# Altium footprint library JL_PCB.PCBLIB: 1129 footprints (part 52 of 72)
Each footprint in its own frame and in the unit in brackets; x right, y up, seen from the top. Pads: shape width x height; smd on the part's side, far side on the other; paste and mask are expansions set on the pad; w line width, h text height; cw(c..) or ccw(c..) is an arc to the next point about the centre after c.
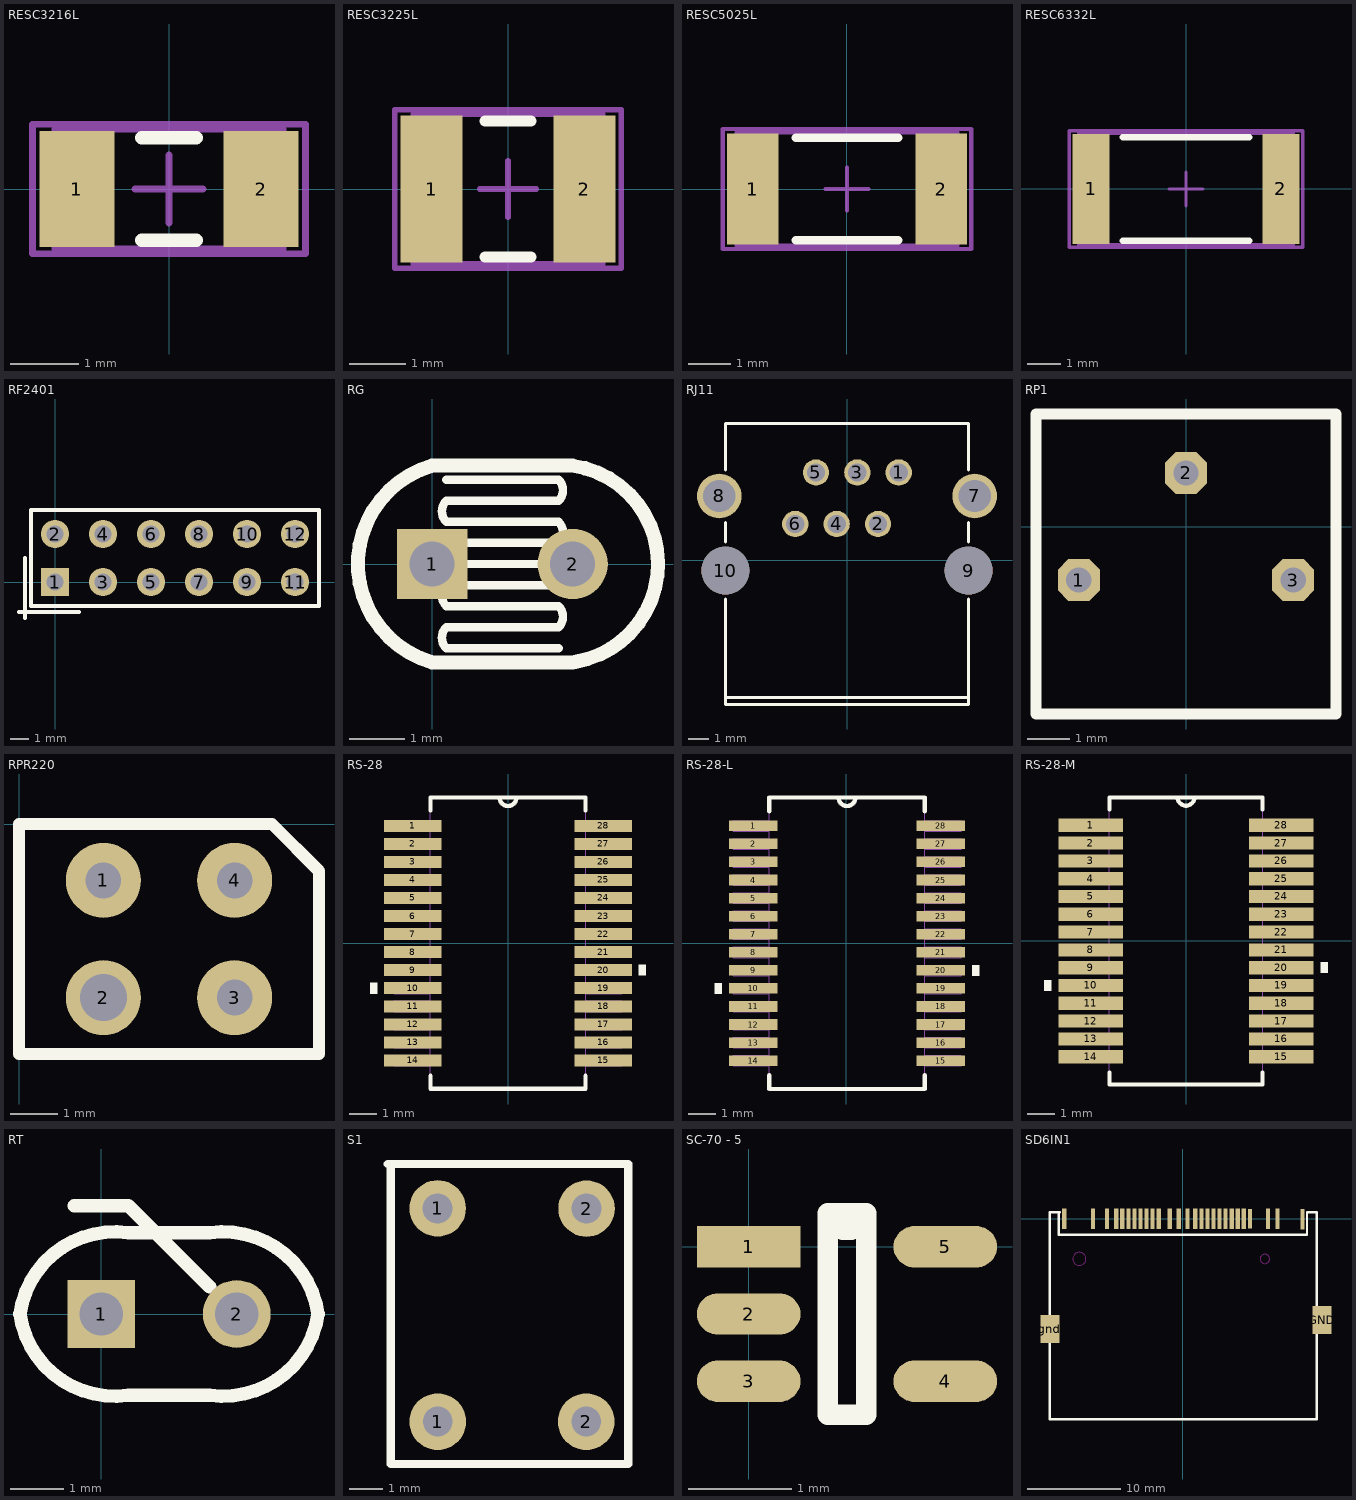
[diagram p51: the footprints below, top view; thin cyan lines are the x and y axes]

## RESC3216L [mm] "Chip Resistor, Body 3.1x1.6mm, IPC High Density"
height 2.54
pads (2):
  rect 1.1x1.7 smd: 1(-1.35,0) 2(1.35,0)
TopOverlay:
  lines w0.2: -0.4,-0.75 0.4,-0.75 ; -0.4,0.75 0.4,0.75
Mechanical13:
  lines w0.1: -1.675,-0.875 -1.675,0.875 1.675,0.875 1.675,-0.875 -1.675,-0.875
Mechanical15:
  lines w0.1: -0.5,0 0.5,0 ; 0,-0.5 0,0.5 ; -2,-0.95 -2,0.95 2,0.95 2,-0.95 -2,-0.95
3D body: height 2.54, standoff 0, extent -1.675,-0.875 1.675,0.875

## RESC3225L [mm] "Chip Resistor, Body 3.2x2.5mm, IPC High Density"
height 0.9
pads (2):
  rect 1.1x2.6 smd: 1(-1.35,0) 2(1.35,0)
TopOverlay:
  lines w0.2: -0.4,-1.2 0.4,-1.2 ; -0.4,1.2 0.4,1.2
Mechanical13:
  lines w0.1: -1.675,-1.32 -1.675,1.32 1.675,1.32 1.675,-1.32 -1.675,-1.32
Mechanical15:
  lines w0.1: -0.5,0 0.5,0 ; 0,-0.5 0,0.5 ; -2,-1.4 -2,1.4 2,1.4 2,-1.4 -2,-1.4
3D body: height 0.9, standoff 0, extent -1.675,-1.32 1.675,1.32

## RESC5025L [mm] "Chip Resistor, Body 5.0x2.5mm, IPC High Density"
height 0.9
pads (2):
  rect 1.2x2.6 smd: 1(-2.2,0) 2(2.2,0)
TopOverlay:
  lines w0.2: -1.2,-1.2 1.2,-1.2 ; -1.2,1.2 1.2,1.2
Mechanical13:
  lines w0.1: -2.575,-1.325 -2.575,1.325 2.575,1.325 2.575,-1.325 -2.575,-1.325
Mechanical15:
  lines w0.1: -0.5,0 0.5,0 ; 0,-0.5 0,0.5 ; -2.9,-1.4 -2.9,1.4 2.9,1.4 2.9,-1.4 -2.9,-1.4
3D body: height 0.9, standoff 0, extent -2.575,-1.325 2.575,1.325

## RESC6332L [mm] "Chip Resistor, Body 6.3x3.2mm, IPC High Density"
height 0.9
pads (2):
  rect 1.1x3.3 smd: 1(-2.85,0) 2(2.85,0)
TopOverlay:
  lines w0.2: -1.9,-1.55 1.9,-1.55 ; -1.9,1.55 1.9,1.55
Mechanical13:
  lines w0.1: -3.225,-1.675 3.225,-1.675 3.225,1.675 -3.225,1.675 -3.225,-1.675
Mechanical15:
  lines w0.1: -0.5,0 0.5,0 ; 0,-0.5 0,0.5 ; -3.5,-1.75 3.5,-1.75 3.5,1.75 -3.5,1.75 -3.5,-1.75
3D body: height 0.9, standoff 0, extent -3.225,-1.675 3.225,1.675

## RF2401 [mm]
pads (12):
  rect 1.5x1.5 hole 0.9: 1(0,0)
  round 1.5 hole 0.9: 2(0,2.54) 3(2.54,0) 4(2.54,2.54) 5(5.08,0) 6(5.08,2.54) 7(7.62,0) 8(7.62,2.54) 9(10.16,0) 10(10.16,2.54) 11(12.7,0) 12(12.7,2.54)
TopOverlay:
  lines w0.2: -1.27,-1.27 -1.27,3.81 13.97,3.81 13.97,-1.27 -1.27,-1.27
  lines w0.203: -1.905,-1.587 1.27,-1.587 ; -1.587,-1.905 -1.587,1.27
3D body "RF2401.STEP": height 57.51, standoff -4.96, extent -2.15,-1.27 14.85,32.73

## RG [mil]
pads (2):
  rect 50x50 hole 32: 1(0,0)
  round 50 hole 32: 2(100,0)
TopOverlay:
  lines w6: 10,60 90,60 cw(c82.5,52.5) 90,45 10,45 ccw(c17.5,37.5) 10,30 90,30 cw(c82.5,22.5) 90,15 10,15 ccw(c17.5,7.5) 10,0 90,0 cw(c82.5,-7.5) 90,-15 10,-15 ccw(c17.5,-22.5) 10,-30 90,-30 cw(c82.5,-37.5) 90,-45 10,-45 ccw(c17.5,-52.5) 10,-60 90,-60
  lines w10: 100,-70 0,-70 cw(c20,0) 0,70 100,70 cw(c90,0) 101.62,-69.75

## RJ11 [mm]
height 14.75
pads (10):
  round 1.3 hole 0.9 mask+0.05: 1(2.55,4.34) 2(1.53,1.8) 3(0.51,4.34) 4(-0.51,1.8) 5(-1.53,4.34) 6(-2.55,1.8)
  round 2.2 hole 1.6 mask+0.05: 7(6.3,3.18) 8(-6.3,3.18)
  round 2.36 hole 2.36 unplated mask+0.05: 9(6,-0.5) 10(-6,-0.5)
TopOverlay:
  lines w0.15: -6,-1.9 -6,-6.75 ; -6,0.9 -6,1.875 ; -6,4.475 -6,6.75 6,6.75 6,4.475 ; 6,-1.9 6,-6.75 ; 6,0.9 6,1.875 ; -6,-6.75 -6,-7.1 6,-7.1 6,-6.75 ; -6,-6.75 6,-6.75

## RP1 [mm]
pads (3):
  oct 1x1 hole 0.6: 1(-2.54,-1.27) 2(0,1.27) 3(2.54,-1.27)
TopOverlay:
  lines w0.254: -3.556,-4.445 3.556,-4.445 3.556,2.667 -3.556,2.667 -3.556,-4.445
3D body "RP1.STEP": height 6.35, standoff -5.08, extent -3.556,-4.445 3.556,2.667

## RPR220 [mm]
pads (4):
  round 1.6 hole 0.762: 1(1.8,-1.2) 3(4.6,-3.7) 4(4.6,-1.2)
  round 1.6 hole 1: 2(1.8,-3.7)
TopOverlay:
  lines w0.254: 0,-4.9 6.4,-4.9 6.4,-1 5.4,0 5,0 0,0 0,-4.9

## RS-28 [mil]
pads (28):
  rect 81x17 smd mask+4: 1(-135,166.34) 2(-135,140.75) 3(-135,115.16) 4(-135,89.57) 5(-135,63.98) 6(-135,38.39) 7(-135,12.8) 8(-135,-12.8) 9(-135,-38.39) 10(-135,-63.98) 11(-135,-89.57) 12(-135,-115.16) 13(-135,-140.75) 14(-135,-166.34) 15(135,-166.34) 16(135,-140.75) 17(135,-115.16) 18(135,-89.57) 19(135,-63.98) 20(135,-38.39) 21(135,-12.8) 22(135,12.8) 23(135,38.39) 24(135,63.98) 25(135,89.57) 26(135,115.16) 27(135,140.75) 28(135,166.34)
TopOverlay:
  region: -185.5,-56.48 -195.5,-56.48 -195.5,-71.48 -185.5,-71.48
  region: 185.5,-30.89 195.5,-30.89 195.5,-45.89 185.5,-45.89
  lines w6: -110,-187.94 -110,-206.5 110,-206.5 110,-187.94 ; -110,187.94 -110,206.5 110,206.5 110,187.94 ; -12,206.5 ccw(c0,206.5) 12,206.5
Mechanical1:
  lines w0: -12,206.5 ccw(c0,206.5) 12,206.5 ; -161.5,-173.84 -161.5,-158.84 -110,-158.84 -110,-173.84 -161.5,-173.84 ; -161.5,-148.25 -161.5,-133.25 -110,-133.25 -110,-148.25 -161.5,-148.25 ; -161.5,-122.66 -161.5,-107.66 -110,-107.66 -110,-122.66 -161.5,-122.66 ; -161.5,-97.07 -161.5,-82.07 -110,-82.07 -110,-97.07 -161.5,-97.07 ; -161.5,-71.48 -161.5,-56.48 -110,-56.48 -110,-71.48 -161.5,-71.48 ; -161.5,-45.89 -161.5,-30.89 -110,-30.89 -110,-45.89 -161.5,-45.89 ; -161.5,-20.3 -161.5,-5.3 -110,-5.3 -110,-20.3 -161.5,-20.3 ; -161.5,5.3 -161.5,20.3 -110,20.3 -110,5.3 -161.5,5.3 ; -161.5,30.89 -161.5,45.89 -110,45.89 -110,30.89 -161.5,30.89 ; -161.5,56.48 -161.5,71.48 -110,71.48 -110,56.48 -161.5,56.48 ; -161.5,82.07 -161.5,97.07 -110,97.07 -110,82.07 -161.5,82.07 ; -161.5,107.66 -161.5,122.66 -110,122.66 -110,107.66 -161.5,107.66 ; -161.5,133.25 -161.5,148.25 -110,148.25 -110,133.25 -161.5,133.25 ; -161.5,158.84 -161.5,173.84 -110,173.84 -110,158.84 -161.5,158.84 ; -110,-206.5 110,-206.5 110,206.5 -110,206.5 -110,-206.5 ; 110,-173.84 110,-158.84 161.5,-158.84 161.5,-173.84 110,-173.84 ; 110,-148.25 110,-133.25 161.5,-133.25 161.5,-148.25 110,-148.25 ; 110,-122.66 110,-107.66 161.5,-107.66 161.5,-122.66 110,-122.66 ; 110,-97.07 110,-82.07 161.5,-82.07 161.5,-97.07 110,-97.07 ; 110,-71.48 110,-56.48 161.5,-56.48 161.5,-71.48 110,-71.48 ; 110,-45.89 110,-30.89 161.5,-30.89 161.5,-45.89 110,-45.89 ; 110,-20.3 110,-5.3 161.5,-5.3 161.5,-20.3 110,-20.3 ; 110,5.3 110,20.3 161.5,20.3 161.5,5.3 110,5.3 ; 110,30.89 110,45.89 161.5,45.89 161.5,30.89 110,30.89 ; 110,56.48 110,71.48 161.5,71.48 161.5,56.48 110,56.48 ; 110,82.07 110,97.07 161.5,97.07 161.5,82.07 110,82.07 ; 110,107.66 110,122.66 161.5,122.66 161.5,107.66 110,107.66 ; 110,133.25 110,148.25 161.5,148.25 161.5,133.25 110,133.25 ; 110,158.84 110,173.84 161.5,173.84 161.5,158.84 110,158.84

## RS-28-L [mil]
pads (28):
  rect 69x15 smd mask+4: 1(-132,166.34) 2(-132,140.75) 3(-132,115.16) 4(-132,89.57) 5(-132,63.98) 6(-132,38.39) 7(-132,12.8) 8(-132,-12.8) 9(-132,-38.39) 10(-132,-63.98) 11(-132,-89.57) 12(-132,-115.16) 13(-132,-140.75) 14(-132,-166.34) 15(134,-166.34) 16(134,-140.75) 17(134,-115.16) 18(134,-89.57) 19(134,-63.98) 20(134,-38.39) 21(134,-12.8) 22(134,12.8) 23(134,38.39) 24(134,63.98) 25(134,89.57) 26(134,115.16) 27(134,140.75) 28(134,166.34)
TopOverlay:
  region: -176.5,-56.48 -186.5,-56.48 -186.5,-71.48 -176.5,-71.48
  region: 178.5,-30.89 188.5,-30.89 188.5,-45.89 178.5,-45.89
  lines w6: -109,-186.94 -109,-206.5 111,-206.5 111,-186.94 ; -109,186.94 -109,206.5 111,206.5 111,186.94 ; -11,206.5 ccw(c1,206.5) 13,206.5
Mechanical1:
  lines w0: -11,206.5 ccw(c1,206.5) 13,206.5 ; -160.5,-173.84 -160.5,-158.84 -109,-158.84 -109,-173.84 -160.5,-173.84 ; -160.5,-148.25 -160.5,-133.25 -109,-133.25 -109,-148.25 -160.5,-148.25 ; -160.5,-122.66 -160.5,-107.66 -109,-107.66 -109,-122.66 -160.5,-122.66 ; -160.5,-97.07 -160.5,-82.07 -109,-82.07 -109,-97.07 -160.5,-97.07 ; -160.5,-71.48 -160.5,-56.48 -109,-56.48 -109,-71.48 -160.5,-71.48 ; -160.5,-45.89 -160.5,-30.89 -109,-30.89 -109,-45.89 -160.5,-45.89 ; -160.5,-20.3 -160.5,-5.3 -109,-5.3 -109,-20.3 -160.5,-20.3 ; -160.5,5.3 -160.5,20.3 -109,20.3 -109,5.3 -160.5,5.3 ; -160.5,30.89 -160.5,45.89 -109,45.89 -109,30.89 -160.5,30.89 ; -160.5,56.48 -160.5,71.48 -109,71.48 -109,56.48 -160.5,56.48 ; -160.5,82.07 -160.5,97.07 -109,97.07 -109,82.07 -160.5,82.07 ; -160.5,107.66 -160.5,122.66 -109,122.66 -109,107.66 -160.5,107.66 ; -160.5,133.25 -160.5,148.25 -109,148.25 -109,133.25 -160.5,133.25 ; -160.5,158.84 -160.5,173.84 -109,173.84 -109,158.84 -160.5,158.84 ; -109,-206.5 111,-206.5 111,206.5 -109,206.5 -109,-206.5 ; 111,-173.84 111,-158.84 162.5,-158.84 162.5,-173.84 111,-173.84 ; 111,-148.25 111,-133.25 162.5,-133.25 162.5,-148.25 111,-148.25 ; 111,-122.66 111,-107.66 162.5,-107.66 162.5,-122.66 111,-122.66 ; 111,-97.07 111,-82.07 162.5,-82.07 162.5,-97.07 111,-97.07 ; 111,-71.48 111,-56.48 162.5,-56.48 162.5,-71.48 111,-71.48 ; 111,-45.89 111,-30.89 162.5,-30.89 162.5,-45.89 111,-45.89 ; 111,-20.3 111,-5.3 162.5,-5.3 162.5,-20.3 111,-20.3 ; 111,5.3 111,20.3 162.5,20.3 162.5,5.3 111,5.3 ; 111,30.89 111,45.89 162.5,45.89 162.5,30.89 111,30.89 ; 111,56.48 111,71.48 162.5,71.48 162.5,56.48 111,56.48 ; 111,82.07 111,97.07 162.5,97.07 162.5,82.07 111,82.07 ; 111,107.66 111,122.66 162.5,122.66 162.5,107.66 111,107.66 ; 111,133.25 111,148.25 162.5,148.25 162.5,133.25 111,133.25 ; 111,158.84 111,173.84 162.5,173.84 162.5,158.84 111,158.84

## RS-28-M [mil]
pads (28):
  rect 93x19 smd mask+4: 1(-137,166.34) 2(-137,140.75) 3(-137,115.16) 4(-137,89.57) 5(-137,63.98) 6(-137,38.39) 7(-137,12.8) 8(-137,-12.8) 9(-137,-38.39) 10(-137,-63.98) 11(-137,-89.57) 12(-137,-115.16) 13(-137,-140.75) 14(-137,-166.34) 15(137,-166.34) 16(137,-140.75) 17(137,-115.16) 18(137,-89.57) 19(137,-63.98) 20(137,-38.39) 21(137,-12.8) 22(137,12.8) 23(137,38.39) 24(137,63.98) 25(137,89.57) 26(137,115.16) 27(137,140.75) 28(137,166.34)
TopOverlay:
  region: -193.5,-56.48 -203.5,-56.48 -203.5,-71.48 -193.5,-71.48
  region: 193.5,-30.89 203.5,-30.89 203.5,-45.89 193.5,-45.89
  lines w6: -110,-188.94 -110,-206.5 110,-206.5 110,-188.94 ; -110,188.94 -110,206.5 110,206.5 110,188.94 ; -12,206.5 ccw(c0,206.5) 12,206.5
Mechanical1:
  lines w0: -12,206.5 ccw(c0,206.5) 12,206.5 ; -161.5,-173.84 -161.5,-158.84 -110,-158.84 -110,-173.84 -161.5,-173.84 ; -161.5,-148.25 -161.5,-133.25 -110,-133.25 -110,-148.25 -161.5,-148.25 ; -161.5,-122.66 -161.5,-107.66 -110,-107.66 -110,-122.66 -161.5,-122.66 ; -161.5,-97.07 -161.5,-82.07 -110,-82.07 -110,-97.07 -161.5,-97.07 ; -161.5,-71.48 -161.5,-56.48 -110,-56.48 -110,-71.48 -161.5,-71.48 ; -161.5,-45.89 -161.5,-30.89 -110,-30.89 -110,-45.89 -161.5,-45.89 ; -161.5,-20.3 -161.5,-5.3 -110,-5.3 -110,-20.3 -161.5,-20.3 ; -161.5,5.3 -161.5,20.3 -110,20.3 -110,5.3 -161.5,5.3 ; -161.5,30.89 -161.5,45.89 -110,45.89 -110,30.89 -161.5,30.89 ; -161.5,56.48 -161.5,71.48 -110,71.48 -110,56.48 -161.5,56.48 ; -161.5,82.07 -161.5,97.07 -110,97.07 -110,82.07 -161.5,82.07 ; -161.5,107.66 -161.5,122.66 -110,122.66 -110,107.66 -161.5,107.66 ; -161.5,133.25 -161.5,148.25 -110,148.25 -110,133.25 -161.5,133.25 ; -161.5,158.84 -161.5,173.84 -110,173.84 -110,158.84 -161.5,158.84 ; -110,-206.5 110,-206.5 110,206.5 -110,206.5 -110,-206.5 ; 110,-173.84 110,-158.84 161.5,-158.84 161.5,-173.84 110,-173.84 ; 110,-148.25 110,-133.25 161.5,-133.25 161.5,-148.25 110,-148.25 ; 110,-122.66 110,-107.66 161.5,-107.66 161.5,-122.66 110,-122.66 ; 110,-97.07 110,-82.07 161.5,-82.07 161.5,-97.07 110,-97.07 ; 110,-71.48 110,-56.48 161.5,-56.48 161.5,-71.48 110,-71.48 ; 110,-45.89 110,-30.89 161.5,-30.89 161.5,-45.89 110,-45.89 ; 110,-20.3 110,-5.3 161.5,-5.3 161.5,-20.3 110,-20.3 ; 110,5.3 110,20.3 161.5,20.3 161.5,5.3 110,5.3 ; 110,30.89 110,45.89 161.5,45.89 161.5,30.89 110,30.89 ; 110,56.48 110,71.48 161.5,71.48 161.5,56.48 110,56.48 ; 110,82.07 110,97.07 161.5,97.07 161.5,82.07 110,82.07 ; 110,107.66 110,122.66 161.5,122.66 161.5,107.66 110,107.66 ; 110,133.25 110,148.25 161.5,148.25 161.5,133.25 110,133.25 ; 110,158.84 110,173.84 161.5,173.84 161.5,158.84 110,158.84

## RT [mil]
pads (2):
  rect 50x50 hole 32: 1(0,0)
  round 50 hole 32: 2(100,0)
TopOverlay:
  lines w10: -20,80 20,80 80,20 ; -60,0 cw(c10,-10) 20,60 80,60 cw(c90,-10) 160,0 cw(c90,10) 80,-60 20,-60 cw(c10,10) -60,0

## S1 [mm]
pads (4):
  round 1.7 hole 0.9: 1(13.618,-10.162) 1(13.62,-16.57) 2(18.08,-16.57) 2(18.09,-10.17)
TopOverlay:
  lines w0.254: 12.12,-8.83 19.34,-8.83 19.34,-17.84 12.21,-17.84 12.21,-8.92

## SC-70 - 5 [mm]
pads (5):
  rect 1x0.4 smd: 1(0,0)
  oval 1x0.4 smd: 2(0,-0.65) 3(0,-1.3) 4(1.9,-1.3) 5(1.9,0)
TopOverlay:
  lines w0.2: 0.765,-1.625 1.135,-1.625 1.135,0.325 0.787,0.325 ccw(c0.95,0.325) 1.112,0.325 0.765,0.325 0.765,-1.625

## SD6IN1 [mm]
pads (29):
  rect 0.45x2.2 smd: 1(-9.636,-0.007) 2(-8.136,-0.007) 3(-7.136,-0.007) 4(-6.486,-0.007) 5(-5.836,-0.007) 6(-5.186,-0.007) 7(-4.536,-0.007) 8(-3.886,-0.007) 9(-3.236,-0.007) 10(-2.586,-0.007) 11(-1.396,-0.007) 12(-0.446,-0.007) 13(0.504,-0.007) 14(1.34,-0.007) 15(1.99,-0.007) 16(2.64,-0.007) 17(3.29,-0.007) 18(3.94,-0.007) 19(4.59,-0.007) 20(5.24,-0.007) 24(9.134,-0.007) 25(10.164,-0.007) 25(12.824,-0.058) 26(-12.716,-0.007)
  rect 0.44x2.2 smd: 21(5.89,-0.007) 22(6.54,-0.007)
  rect 0.45x2.1 smd: 23(7.19,-0.007)
  rect 2x3 smd: gnd(-14.246,-11.833) GND(14.929,-10.883)
TopOverlay:
  lines w0.254: -13.408,0.704 -13.306,0.704 ; -13.179,0.704 -14.271,0.704 -14.271,-21.521 14.354,-21.521 14.354,0.704 13.643,0.704 13.313,0.704 13.313,-1.709 -13.306,-1.709 ; -13.306,-1.709 -13.306,0.704 ; -13.306,-1.709 -13.306,0.704
KeepOutLayer:
  lines w0.1: -11.796,-4.307 cw(c-11.096,-4.307) -10.396,-4.307 cw(c-11.096,-4.307) -11.796,-4.307 ; 8.304,-4.307 cw(c8.804,-4.307) 9.304,-4.307 cw(c8.804,-4.307) 8.304,-4.307